# Altium footprint library XU-GENARAL PCB .PcbLib: 1176 footprints (part 7 of 75)
Each footprint in its own frame and in the unit in brackets; x right, y up, seen from the top. Pads: shape width x height; smd on the part's side, far side on the other; paste and mask are expansions set on the pad; w line width, h text height; cw(c..) or ccw(c..) is an arc to the next point about the centre after c.
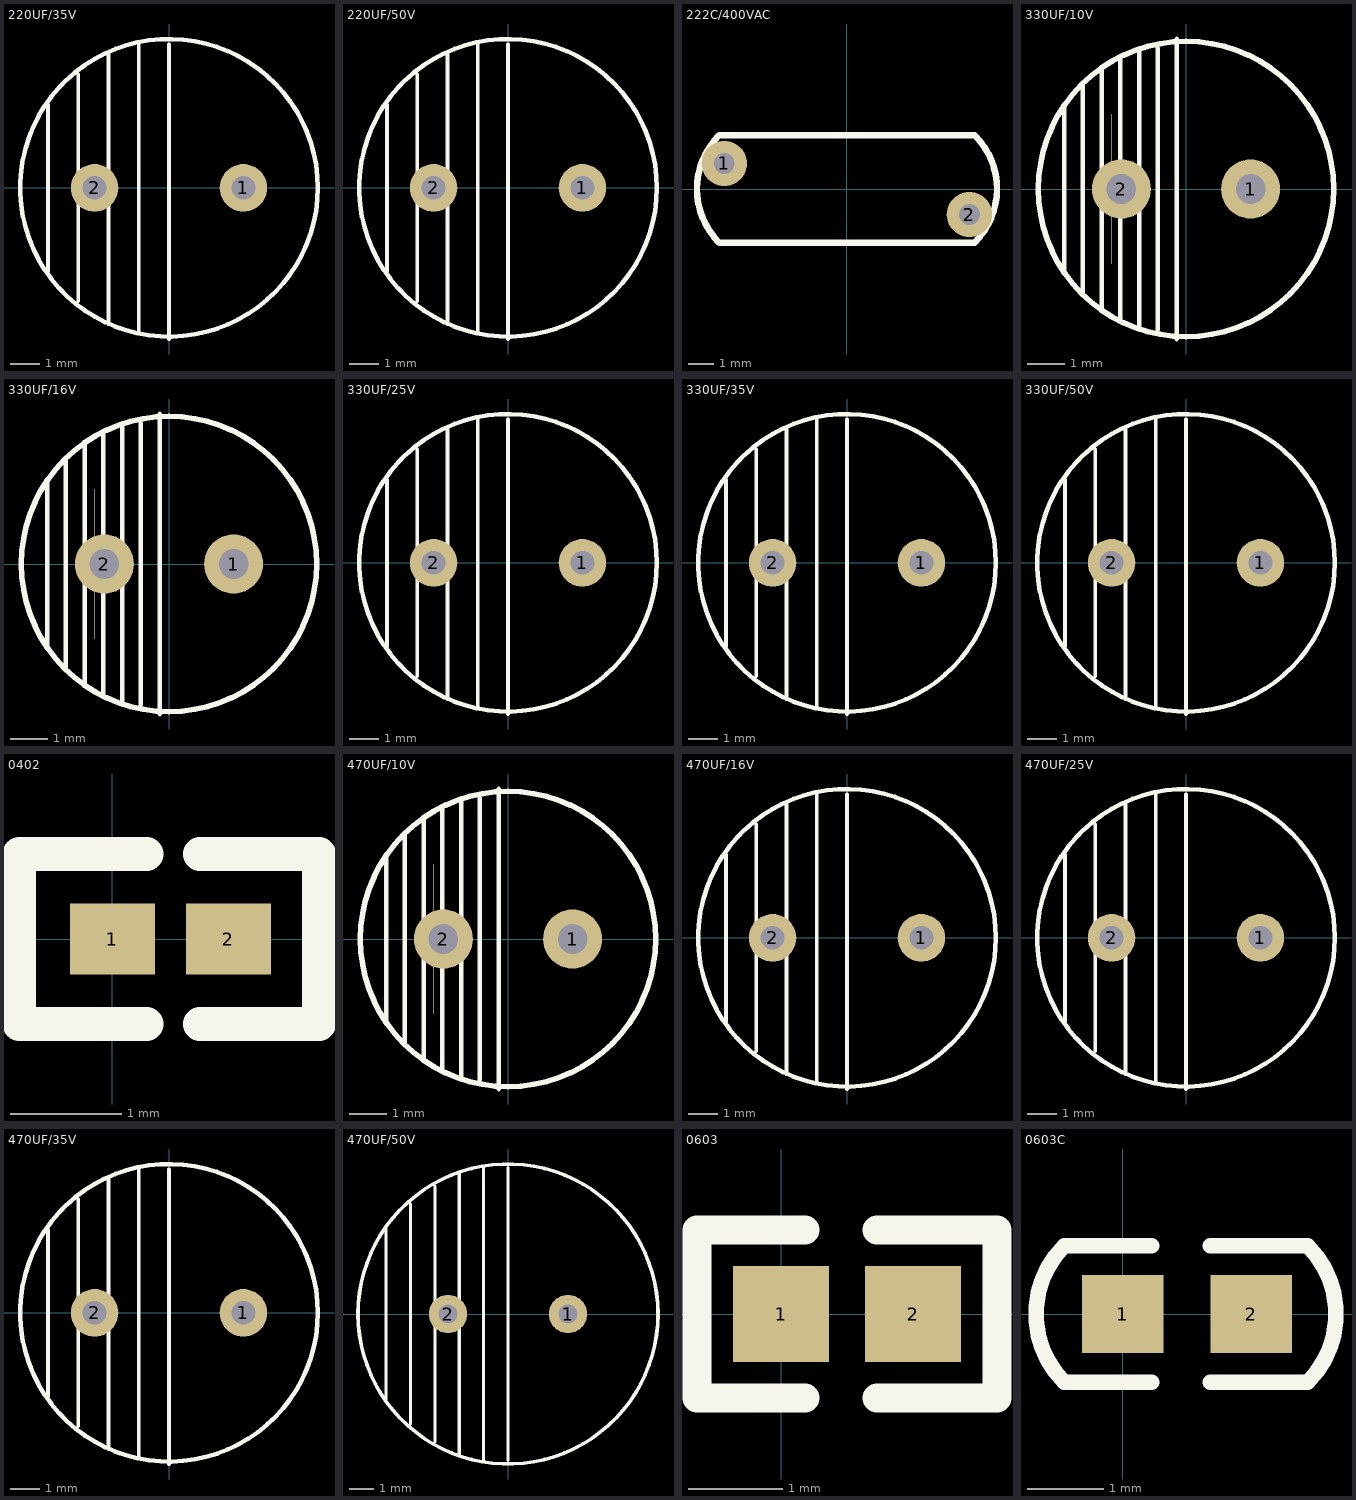
[diagram p6: the footprints below, top view; thin cyan lines are the x and y axes]

## 220UF/35V [mm]
pads (2):
  round 1.6 hole 0.8: 1(2.5,0) 2(-2.5,0)
Top Overlay:
  circle w0.152: c0,0 r5
  rectangle: -2.032,-2.032 -2.032,2.032
  lines w0.127: -4.064,-2.794 -4.064,2.794 ; -3.048,-3.81 -3.048,3.81 ; -2.032,-4.572 -2.032,4.572 ; -1.016,-4.826 -1.016,4.826 ; 0,-5.08 0,4.826

## 220UF/50V [mm]
pads (2):
  round 1.6 hole 0.8: 1(2.5,0) 2(-2.5,0)
Top Overlay:
  circle w0.152: c0,0 r5
  rectangle: -2.032,-2.032 -2.032,2.032
  lines w0.127: -4.064,-2.794 -4.064,2.794 ; -3.048,-3.81 -3.048,3.81 ; -2.032,-4.572 -2.032,4.572 ; -1.016,-4.826 -1.016,4.826 ; 0,-5.08 0,4.826

## 222C/400VAC [mil]
pads (2):
  round 70 hole 32: 1(-188.98,39.37) 2(188.98,-39.37)
Top Overlay:
  lines w10: 196.85,82.68 -196.85,82.68 ccw(c-114.17,0) -196.85,-82.68 196.85,-82.68 ccw(c115.09,0.24) 198,82

## 330UF/10V [mm]
pads (2):
  round 1.6 hole 0.8: 1(1.75,0) 2(-1.75,0)
Top Overlay:
  circle w0.152: c0,0 r4
  rectangle: -2.032,-2.032 -2.032,2.032
  lines w0.127: -3.302,-2.286 -3.302,2.286 ; -2.794,-2.794 -2.794,2.794 ; -2.286,-3.302 -2.286,3.302 ; -1.778,-3.556 -1.778,3.556 ; -1.27,-3.81 -1.27,3.81 ; -0.762,-3.81 -0.762,3.81 ; -0.254,-4.064 -0.254,4.064

## 330UF/16V [mm]
pads (2):
  round 1.6 hole 0.8: 1(1.75,0) 2(-1.75,0)
Top Overlay:
  circle w0.152: c0,0 r4
  rectangle: -2.032,-2.032 -2.032,2.032
  lines w0.127: -3.302,-2.286 -3.302,2.286 ; -2.794,-2.794 -2.794,2.794 ; -2.286,-3.302 -2.286,3.302 ; -1.778,-3.556 -1.778,3.556 ; -1.27,-3.81 -1.27,3.81 ; -0.762,-3.81 -0.762,3.81 ; -0.254,-4.064 -0.254,4.064

## 330UF/25V [mm]
pads (2):
  round 1.6 hole 0.8: 1(2.5,0) 2(-2.5,0)
Top Overlay:
  circle w0.152: c0,0 r5
  rectangle: -2.032,-2.032 -2.032,2.032
  lines w0.127: -4.064,-2.794 -4.064,2.794 ; -3.048,-3.81 -3.048,3.81 ; -2.032,-4.572 -2.032,4.572 ; -1.016,-4.826 -1.016,4.826 ; 0,-5.08 0,4.826

## 330UF/35V [mm]
pads (2):
  round 1.6 hole 0.8: 1(2.5,0) 2(-2.5,0)
Top Overlay:
  circle w0.152: c0,0 r5
  rectangle: -2.032,-2.032 -2.032,2.032
  lines w0.127: -4.064,-2.794 -4.064,2.794 ; -3.048,-3.81 -3.048,3.81 ; -2.032,-4.572 -2.032,4.572 ; -1.016,-4.826 -1.016,4.826 ; 0,-5.08 0,4.826

## 330UF/50V [mm]
pads (2):
  round 1.6 hole 0.8: 1(2.5,0) 2(-2.5,0)
Top Overlay:
  circle w0.152: c0,0 r5
  rectangle: -2.032,-2.032 -2.032,2.032
  lines w0.127: -4.064,-2.794 -4.064,2.794 ; -3.048,-3.81 -3.048,3.81 ; -2.032,-4.572 -2.032,4.572 ; -1.016,-4.826 -1.016,4.826 ; 0,-5.08 0,4.826

## 0402 [mil]
pads (2):
  rect 30x25 smd: 1(0,0) 2(41,0)
Top Overlay:
  lines w12: 12,-30 -33,-30 -33,30 12,30 ; 31,-30 73,-30 73,30 31,30

## 470UF/10V [mm]
pads (2):
  round 1.6 hole 0.8: 1(1.75,0) 2(-1.75,0)
Top Overlay:
  circle w0.152: c0,0 r4
  rectangle: -2.032,-2.032 -2.032,2.032
  lines w0.127: -3.302,-2.286 -3.302,2.286 ; -2.794,-2.794 -2.794,2.794 ; -2.286,-3.302 -2.286,3.302 ; -1.778,-3.556 -1.778,3.556 ; -1.27,-3.81 -1.27,3.81 ; -0.762,-3.81 -0.762,3.81 ; -0.254,-4.064 -0.254,4.064

## 470UF/16V [mm]
pads (2):
  round 1.6 hole 0.8: 1(2.5,0) 2(-2.5,0)
Top Overlay:
  circle w0.152: c0,0 r5
  rectangle: -2.032,-2.032 -2.032,2.032
  lines w0.127: -4.064,-2.794 -4.064,2.794 ; -3.048,-3.81 -3.048,3.81 ; -2.032,-4.572 -2.032,4.572 ; -1.016,-4.826 -1.016,4.826 ; 0,-5.08 0,4.826

## 470UF/25V [mm]
pads (2):
  round 1.6 hole 0.8: 1(2.5,0) 2(-2.5,0)
Top Overlay:
  circle w0.152: c0,0 r5
  rectangle: -2.032,-2.032 -2.032,2.032
  lines w0.127: -4.064,-2.794 -4.064,2.794 ; -3.048,-3.81 -3.048,3.81 ; -2.032,-4.572 -2.032,4.572 ; -1.016,-4.826 -1.016,4.826 ; 0,-5.08 0,4.826

## 470UF/35V [mm]
pads (2):
  round 1.6 hole 0.8: 1(2.5,0) 2(-2.5,0)
Top Overlay:
  circle w0.152: c0,0 r5
  rectangle: -2.032,-2.032 -2.032,2.032
  lines w0.127: -4.064,-2.794 -4.064,2.794 ; -3.048,-3.81 -3.048,3.81 ; -2.032,-4.572 -2.032,4.572 ; -1.016,-4.826 -1.016,4.826 ; 0,-5.08 0,4.826

## 470UF/50V [mm]
pads (2):
  round 1.6 hole 0.8: 1(2.5,0) 2(-2.5,0)
Top Overlay:
  circle w0.152: c0,0 r6.25
  rectangle: -2.032,-2.032 -2.032,2.032
  lines w0.127: -5.08,-3.556 -5.08,3.556 ; -4.064,-4.572 -4.064,4.572 ; -4.064,-2.794 -4.064,2.794 ; -3.048,-5.334 -3.048,5.334 ; -3.048,-3.81 -3.048,3.81 ; -2.032,-5.842 -2.032,5.842 ; -2.032,-4.572 -2.032,4.572 ; -1.016,-6.096 -1.016,6.096 ; -1.016,-4.826 -1.016,4.826 ; 0,-6.096 0,6.096 ; 0,-5.08 0,4.826

## 0603 [mil]
pads (2):
  rect 40x40 smd: 1(0,0) 2(55,0)
Top Overlay:
  lines w12: 10,-35 -35,-35 -35,35 10,35 ; 40,-35 90,-35 90,35 40,35

## 0603C [mil]
pads (2):
  rect 42x40 smd: 1(0,0) 2(66,0)
Top Overlay:
  lines w8: 15,-35 -30,-35 cw(c5,0) -30,35 15,35 ; 45,-35 95,-35 ccw(c60,0) 95,35 45,35